# Altium footprint library Connectors.PcbLib: 408 footprints (part 12 of 26)
Each footprint in its own frame and in the unit in brackets; x right, y up, seen from the top. Pads: shape width x height; smd on the part's side, far side on the other; paste and mask are expansions set on the pad; w line width, h text height; cw(c..) or ccw(c..) is an arc to the next point about the centre after c.
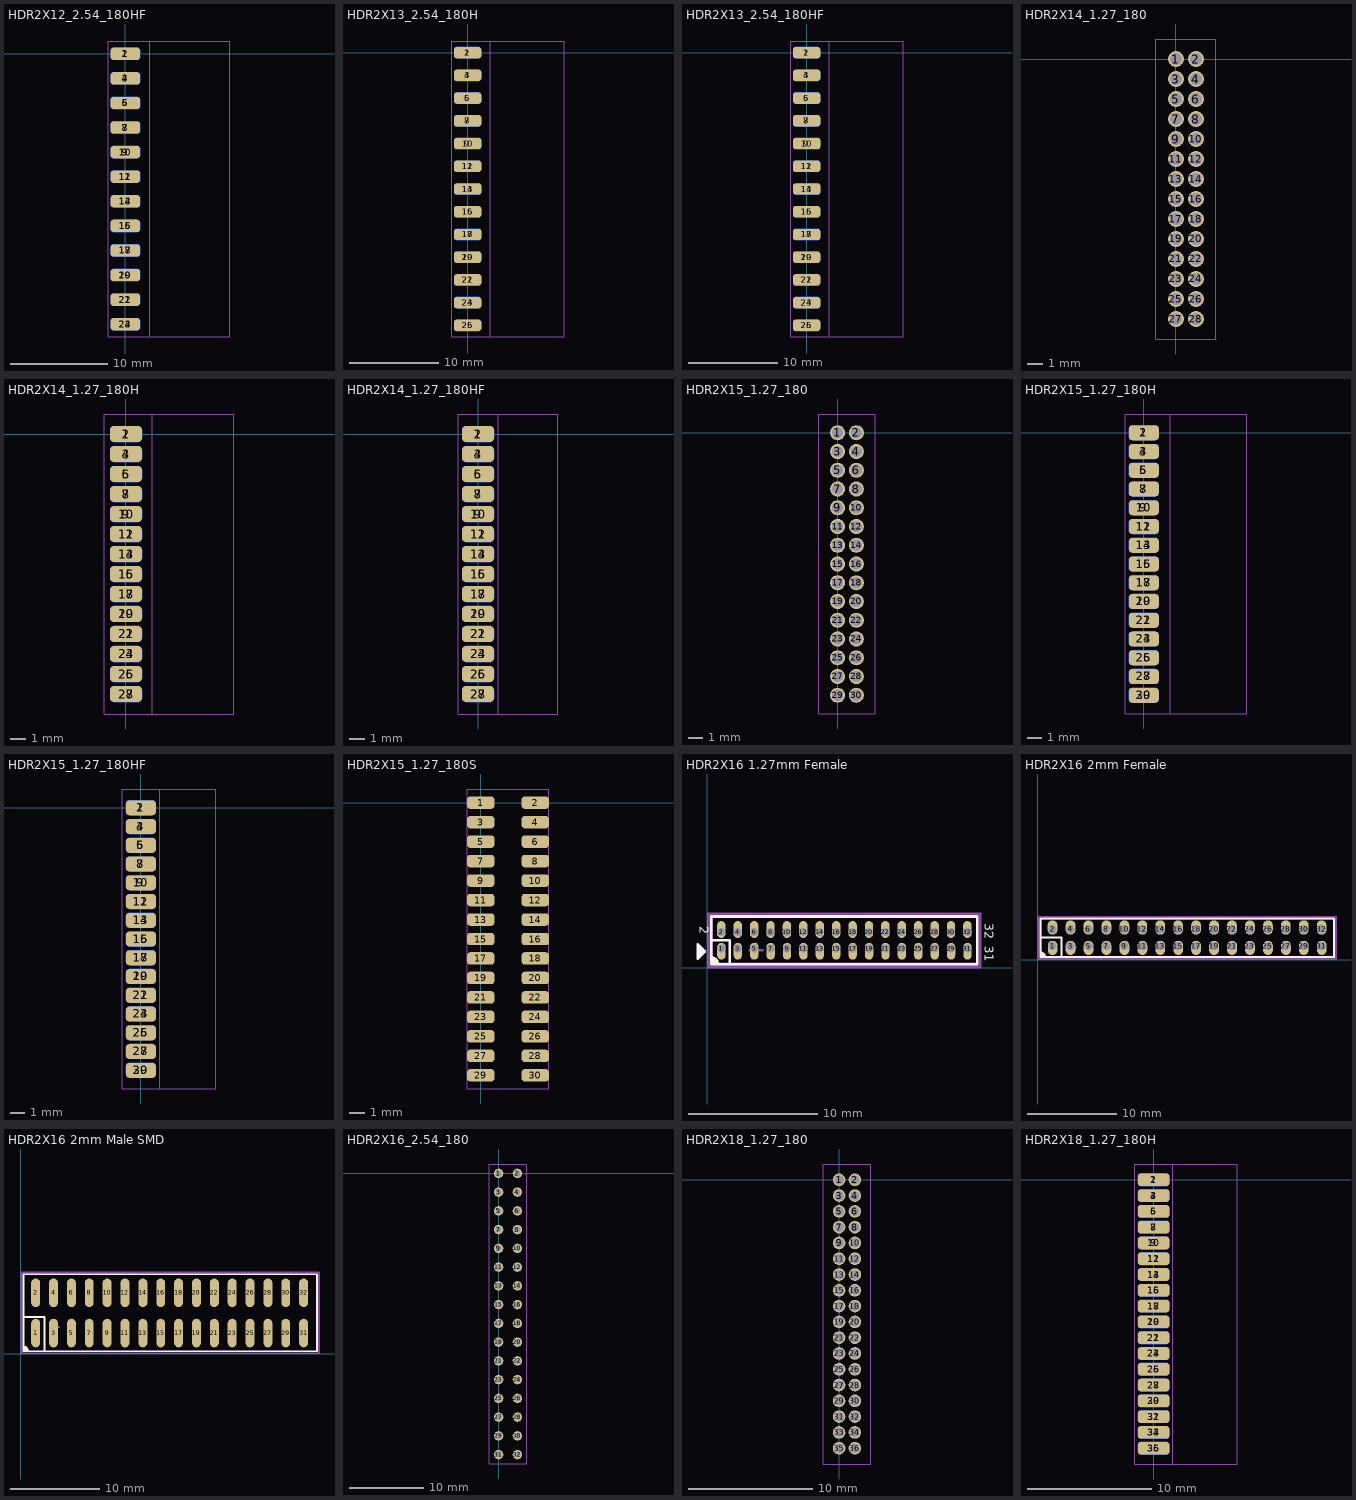
[diagram p11: the footprints below, top view; thin cyan lines are the x and y axes]

## HDR2X12_2.54_180HF [mil]
height 169.29
pads (24):
  rrect50% 120x50 smd: 1(0,0) 3(0,-100) 5(0,-200) 7(0,-300) 9(0,-400) 11(0,-500) 13(0,-600) 15(0,-700) 17(0,-800) 19(0,-900) 21(0,-1000) 23(0,-1100)
  rrect50% 120x50 smd far side: 2(0,0) 4(0,-100) 6(0,-200) 8(0,-300) 10(0,-400) 12(0,-500) 14(0,-600) 16(0,-700) 18(0,-800) 20(0,-900) 22(0,-1000) 24(0,-1100)
Mechanical 13:
  lines w2: -70,-1150 -70,50 425,50 425,-1150 -70,-1150
Mechanical 14:
  lines w2: -70,-1150 -70,50 100,50 100,-1150 -70,-1150
  text ".Designator" at -31,-570 h80
Mechanical 15:
  lines w2: -70,-1150 100,-1150 100,50 -70,50 -70,-1150
3D body "female_header_a-bl254-dg-g24d.stp": height 76.43, standoff -120.43, extent -35.97,-1154.92 424.66,54.92

## HDR2X13_2.54_180H [mil]
height 169.29
pads (26):
  rrect50% 120x50 smd: 1(0,0) 3(0,-100) 5(0,-200) 7(0,-300) 9(0,-400) 11(0,-500) 13(0,-600) 15(0,-700) 17(0,-800) 19(0,-900) 21(0,-1000) 23(0,-1100) 25(0,-1200)
  rrect50% 120x50 smd far side: 2(0,0) 4(0,-100) 6(0,-200) 8(0,-300) 10(0,-400) 12(0,-500) 14(0,-600) 16(0,-700) 18(0,-800) 20(0,-900) 22(0,-1000) 24(0,-1100) 26(0,-1200)
Mechanical 13:
  lines w2: -70,-1250 425,-1250 425,50 -70,50 -70,-1250
Mechanical 14:
  lines w2: -70,-1250 100,-1250 100,50 -70,50 -70,-1250
  text ".Designator" at -31,-620 h80
Mechanical 15:
  lines w2: -70,-1250 100,-1250 100,50 -70,50 -70,-1250
3D body "pin_header_awl254-dg-g26d.stp": height 100, standoff -100, extent -36.38,-1250 416.38,50

## HDR2X13_2.54_180HF [mil]
height 169.29
pads (26):
  rrect50% 120x50 smd: 1(0,0) 3(0,-100) 5(0,-200) 7(0,-300) 9(0,-400) 11(0,-500) 13(0,-600) 15(0,-700) 17(0,-800) 19(0,-900) 21(0,-1000) 23(0,-1100) 25(0,-1200)
  rrect50% 120x50 smd far side: 2(0,0) 4(0,-100) 6(0,-200) 8(0,-300) 10(0,-400) 12(0,-500) 14(0,-600) 16(0,-700) 18(0,-800) 20(0,-900) 22(0,-1000) 24(0,-1100) 26(0,-1200)
Mechanical 13:
  lines w2: -70,-1250 -70,50 425,50 425,-1250 -70,-1250
Mechanical 14:
  lines w2: -70,-1250 -70,50 100,50 100,-1250 -70,-1250
  text ".Designator" at -31,-620 h80
Mechanical 15:
  lines w2: -70,-1250 -70,50 100,50 100,-1250 -70,-1250
3D body "female_header_a-bl254-dg-g26d.stp": height 76.43, standoff -120.43, extent -35.98,-1254.92 424.65,54.92

## HDR2X14_1.27_180 [mil]
height 169.29
pads (28):
  round 40 hole 30: 1(0,0) 2(50,0) 3(0,-50) 4(50,-50) 5(0,-100) 6(50,-100) 7(0,-150) 8(50,-150) 9(0,-200) 10(50,-200) 11(0,-250) 12(50,-250) 13(0,-300) 14(50,-300) 15(0,-350) 16(50,-350) 17(0,-400) 18(50,-400) 19(0,-450) 20(50,-450) 21(0,-500) 22(50,-500) 23(0,-550) 24(50,-550) 25(0,-600) 26(50,-600) 27(0,-650) 28(50,-650)
Mechanical 13:
  lines w2: -50,-700 -50,50 100,50 100,-700 -50,-700
Mechanical 14:
  lines w2: -50,-700 -50,50 100,50 100,-700 -50,-700
  text ".Designator" at -6,-345 h80
3D body "pin_header_a-sl127-dg-g28d.stp": height 210.24, standoff -102.36, extent -73.42,-674.99 123.43,25.01

## HDR2X14_1.27_180H [mil]
height 169.29
pads (28):
  rrect50% 80x40 smd: 1(0,0) 3(0,-50) 5(0,-100) 7(0,-150) 9(0,-200) 11(0,-250) 13(0,-300) 15(0,-350) 17(0,-400) 19(0,-450) 21(0,-500) 23(0,-550) 25(0,-600) 27(0,-650)
  rrect50% 80x40 smd far side: 2(0,0) 4(0,-50) 6(0,-100) 8(0,-150) 10(0,-200) 12(0,-250) 14(0,-300) 16(0,-350) 18(0,-400) 20(0,-450) 22(0,-500) 24(0,-550) 26(0,-600) 28(0,-650)
Mechanical 13:
  lines w2: -55,-700 -55,50 270,50 270,-700 -55,-700
Mechanical 14:
  lines w2: -55,-700 -55,50 65,50 65,-700 -55,-700
  text ".Designator" at -31,-345 h80
3D body "pin_header_a-sl127-dg-g28d.stp": height 76.43, standoff -120.43, extent -41.22,-675 271.38,25

## HDR2X14_1.27_180HF [mil]
height 169.29
pads (28):
  rrect50% 80x40 smd: 1(0,0) 3(0,-50) 5(0,-100) 7(0,-150) 9(0,-200) 11(0,-250) 13(0,-300) 15(0,-350) 17(0,-400) 19(0,-450) 21(0,-500) 23(0,-550) 25(0,-600) 27(0,-650)
  rrect50% 80x40 smd far side: 2(0,0) 4(0,-50) 6(0,-100) 8(0,-150) 10(0,-200) 12(0,-250) 14(0,-300) 16(0,-350) 18(0,-400) 20(0,-450) 22(0,-500) 24(0,-550) 26(0,-600) 28(0,-650)
Mechanical 13:
  lines w2: -50,-700 200,-700 200,50 -50,50 -50,-700
Mechanical 14:
  lines w2: -50,-700 50,-700 50,50 -50,50 -50,-700
  text ".Designator" at -31,-345 h80
3D body "female_header_a-bl127-dg-g28d.stp": height 40.02, standoff -82.02, extent -28.34,-682.88 200.01,32.87

## HDR2X15_1.27_180 [mil]
height 169.29
pads (30):
  round 40 hole 30: 1(0,0) 2(50,0) 3(0,-50) 4(50,-50) 5(0,-100) 6(50,-100) 7(0,-150) 8(50,-150) 9(0,-200) 10(50,-200) 11(0,-250) 12(50,-250) 13(0,-300) 14(50,-300) 15(0,-350) 16(50,-350) 17(0,-400) 18(50,-400) 19(0,-450) 20(50,-450) 21(0,-500) 22(50,-500) 23(0,-550) 24(50,-550) 25(0,-600) 26(50,-600) 27(0,-650) 28(50,-650) 29(0,-700) 30(50,-700)
Mechanical 13:
  lines w2: -50,-750 100,-750 100,50 -50,50 -50,-750
Mechanical 14:
  lines w2: -50,-750 100,-750 100,50 -50,50 -50,-750
  text ".Designator" at -6,-395 h80
3D body "pin_header_a-sl127-dg-g30d.stp": height 210.24, standoff -102.36, extent -73.43,-724.99 123.42,25

## HDR2X15_1.27_180H [mil]
height 169.29
pads (30):
  rrect50% 80x40 smd: 1(0,0) 3(0,-50) 5(0,-100) 7(0,-150) 9(0,-200) 11(0,-250) 13(0,-300) 15(0,-350) 17(0,-400) 19(0,-450) 21(0,-500) 23(0,-550) 25(0,-600) 27(0,-650) 29(0,-700)
  rrect50% 80x40 smd far side: 2(0,0) 4(0,-50) 6(0,-100) 8(0,-150) 10(0,-200) 12(0,-250) 14(0,-300) 16(0,-350) 18(0,-400) 20(0,-450) 22(0,-500) 24(0,-550) 26(0,-600) 28(0,-650) 30(0,-700)
Mechanical 13:
  lines w2: -50,-750 275,-750 275,50 -50,50 -50,-750
Mechanical 14:
  lines w2: -50,-750 70,-750 70,50 -50,50 -50,-750
  text ".Designator" at -26,-370 h80
3D body "pin_header_a-sl127-dg-g30d.stp": height 76.43, standoff -120.43, extent -36.22,-724.99 276.38,25

## HDR2X15_1.27_180HF [mil]
height 169.29
pads (30):
  rrect50% 80x40 smd: 1(0,0) 3(0,-50) 5(0,-100) 7(0,-150) 9(0,-200) 11(0,-250) 13(0,-300) 15(0,-350) 17(0,-400) 19(0,-450) 21(0,-500) 23(0,-550) 25(0,-600) 27(0,-650) 29(0,-700)
  rrect50% 80x40 smd far side: 2(0,0) 4(0,-50) 6(0,-100) 8(0,-150) 10(0,-200) 12(0,-250) 14(0,-300) 16(0,-350) 18(0,-400) 20(0,-450) 22(0,-500) 24(0,-550) 26(0,-600) 28(0,-650) 30(0,-700)
Mechanical 13:
  lines w2: -50,-750 200,-750 200,50 -50,50 -50,-750
Mechanical 14:
  lines w2: -50,-750 50,-750 50,50 -50,50 -50,-750
  text ".Designator" at -31,-370 h80
3D body "female_header_a-bl127-dg-g30d.stp": height 40.02, standoff -82.02, extent -28.34,-732.88 200.01,32.87

## HDR2X15_1.27_180S [mil]
height 169.29
pads (30):
  rrect50% 70x32 smd: 1(0,0) 2(140,0) 3(0,-50) 4(140,-50) 5(0,-100) 6(140,-100) 7(0,-150) 8(140,-150) 9(0,-200) 10(140,-200) 11(0,-250) 12(140,-250) 13(0,-300) 14(140,-300) 15(0,-350) 16(140,-350) 17(0,-400) 18(140,-400) 19(0,-450) 20(140,-450) 21(0,-500) 22(140,-500) 23(0,-550) 24(140,-550) 25(0,-600) 26(140,-600) 27(0,-650) 28(140,-650) 29(0,-700) 30(140,-700)
Mechanical 13:
  lines w2: -35,-735 -35,35 175,35 175,-735 -35,-735
Mechanical 14:
  lines w2: -35,-735 -35,35 175,35 175,-735 -35,-735
  text ".Designator" at 44,-370 h80
3D body "pin_header_a-sl127-dg-g30mp1.stp": height 252.13, standoff 0.25, extent -38.31,-725 178.31,25

## HDR2X16 1.27mm Female [mm]
pads (32):
  oval 0.65x1.3 hole 0.6 copper offset 0,-0.2: 1(1.09,1.5) 3(2.36,1.5) 5(3.631,1.5) 7(4.901,1.5) 9(6.171,1.5) 11(7.442,1.5) 13(8.712,1.5) 15(9.982,1.5) 17(11.253,1.5) 19(12.523,1.5) 21(13.793,1.5) 23(15.064,1.5) 25(16.334,1.5) 27(17.604,1.5) 29(18.875,1.5) 31(20.145,1.5)
  oval 0.65x1.3 hole 0.6 copper offset 0,0.2: 2(1.083,2.78) 4(2.354,2.78) 6(3.624,2.78) 8(4.894,2.78) 10(6.165,2.78) 12(7.435,2.78) 14(8.705,2.78) 16(9.976,2.78) 18(11.246,2.78) 20(12.516,2.78) 22(13.787,2.78) 24(15.057,2.78) 26(16.327,2.78) 28(17.598,2.78) 30(18.868,2.78) 32(20.138,2.78)
Top Overlay:
  rectangle: -0.56,1.06 -0.31,1.5
  rectangle: -0.73,0.92 -0.48,1.65
  region: 0.25,0.3 0.25,0.78 0.5,0.78 0.79,0.49 0.79,0.3
  lines w0.2: 0.3,0.82 cw(c0.3,0.32) 0.8,0.32 ; 0.3,2.15 1.73,2.15 1.73,0.37 ; 0.34,0.64 0.37,0.64 cw(c0.37,0.3) 0.71,0.3 ; -0.74,0.72 -0.74,1.82 -0.19,1.27 -0.74,0.72 ; 0.3,0.3 20.9,0.3 20.9,3.99 0.3,3.99 0.3,0.3
  text "31" at 21.23,1.73 h1.2
  text "32" at 21.23,3.47 h1.2
  text "2" at -0.8,3.22 h1.2
Mechanical 13:
  lines w0.2: 0.32,0.31 0.32,3.97 20.89,3.97 20.89,0.31 0.32,0.31
Mechanical 15:
  lines w0.2: 3.28,1.36 4.28,1.36 ; 3.78,0.86 3.78,1.86 ; 0.09,0.08 21.12,0.08 21.12,4.21 0.09,4.21 0.09,0.08
3D body "2002111100032t1lf.stp": height 5.5, standoff -2.35, extent 0.435,0.44 20.755,3.84

## HDR2X16 2mm Female [mm]
pads (32):
  oval 1.1x1.6 hole 0.9 copper offset 0,-0.2: 1(1.666,1.51) 3(3.674,1.51) 5(5.683,1.51) 7(7.691,1.51) 9(9.699,1.51) 11(11.708,1.51) 13(13.716,1.51) 15(15.724,1.51) 17(17.733,1.51) 19(19.741,1.51) 21(21.749,1.51) 23(23.758,1.51) 25(25.766,1.51) 27(27.774,1.51) 29(29.783,1.51) 31(31.791,1.51)
  oval 1.1x1.6 hole 0.9 copper offset 0,0.2: 2(1.66,3.4) 4(3.669,3.4) 6(5.677,3.4) 8(7.685,3.4) 10(9.694,3.4) 12(11.702,3.4) 14(13.71,3.4) 16(15.719,3.4) 18(17.727,3.4) 20(19.735,3.4) 22(21.744,3.4) 24(23.752,3.4) 26(25.76,3.4) 28(27.769,3.4) 30(29.777,3.4) 32(31.785,3.4)
Top Overlay:
  region: 0.25,0.3 0.25,0.78 0.5,0.78 0.79,0.49 0.79,0.3
  lines w0.2: 0.3,0.82 cw(c0.3,0.32) 0.8,0.32 ; 0.3,2.465 2.665,2.465 2.665,0.37 ; 0.34,0.64 0.37,0.64 cw(c0.37,0.3) 0.71,0.3 ; 0.3,0.3 33.18,0.3 33.18,4.59 0.3,4.59 0.3,0.3
Bottom Overlay:
  region: 0.25,0.3 0.25,0.78 0.5,0.78 0.79,0.49 0.79,0.3
  lines w0.2: 0.3,0.82 cw(c0.3,0.32) 0.8,0.32 ; 0.3,2.465 2.665,2.465 2.665,0.37 ; 0.34,0.64 0.37,0.64 cw(c0.37,0.3) 0.71,0.3 ; 0.3,0.3 33.18,0.3 33.18,4.59 0.3,4.59 0.3,0.3
Mechanical 13:
  lines w0.2: 0.32,0.31 0.32,4.57 33.17,4.57 33.17,0.31 0.32,0.31
Mechanical 15:
  lines w0.2: 3.28,1.36 4.28,1.36 ; 3.78,0.86 3.78,1.86 ; 0.09,0.08 33.39,0.08 33.39,4.8 0.09,4.8 0.09,0.08
3D body "62003221821.stp": height 4.35, standoff -2.65, extent 0.44,0.44 33.04,4.44

## HDR2X16 2mm Male SMD [mm]
pads (32):
  oval 1x3.2 smd: 1(1.657,2.341) 2(1.657,6.841) 3(3.658,2.341) 4(3.658,6.841) 5(5.657,2.341) 6(5.657,6.841) 7(7.657,2.341) 8(7.657,6.841) 9(9.657,2.341) 10(9.657,6.841) 11(11.656,2.341) 12(11.656,6.841) 13(13.656,2.341) 14(13.656,6.841) 15(15.656,2.341) 16(15.656,6.841) 17(17.655,2.341) 18(17.655,6.841) 19(19.655,2.341) 20(19.655,6.841) 21(21.655,2.341) 22(21.655,6.841) 23(23.654,2.341) 24(23.654,6.841) 25(25.654,2.341) 26(25.654,6.841) 27(27.654,2.341) 28(27.654,6.841) 29(29.653,2.341) 30(29.653,6.841) 31(31.653,2.341) 32(31.653,6.841)
Top Overlay:
  region: 0.242,0.301 0.242,0.781 0.492,0.781 0.782,0.491 0.782,0.301
  lines w0.2: 0.292,0.821 cw(c0.292,0.321) 0.792,0.321 ; 0.292,4.138 2.657,4.138 2.657,0.371 ; 0.332,0.641 0.362,0.641 cw(c0.362,0.301) 0.702,0.301 ; 0.292,0.301 33.15,0.301 33.15,8.928 0.292,8.928 0.292,0.301
Mechanical 13:
  lines w0.2: 0.104,0.082 0.104,9.114 33.372,9.114 33.372,0.082 0.104,0.082
Mechanical 15:
  lines w0.2: 3.272,3.001 4.272,3.001 ; 3.772,2.501 3.772,3.501 ; 0.082,0.082 33.372,0.082 33.372,9.12 0.082,9.12 0.082,0.082
3D body "User Library-pin_header_a-sl200-dg-g12mp1.STEP": height 6.5, standoff 0, extent 20.677,1.34 32.627,7.84
3D body "User Library-pin_header_a-sl200-dg-g12mp1.STEP": height 6.5, standoff 0, extent 10.665,1.338 22.615,7.838
3D body "User Library-pin_header_a-sl200-dg-g12mp1.STEP": height 6.5, standoff 0, extent 0.693,1.342 12.643,7.842

## HDR2X16_2.54_180 [mil]
height 169.29
pads (32):
  round 50 hole 32: 1(0,0) 2(100,0) 3(0,-100) 4(100,-100) 5(0,-200) 6(100,-200) 7(0,-300) 8(100,-300) 9(0,-400) 10(100,-400) 11(0,-500) 12(100,-500) 13(0,-600) 14(100,-600) 15(0,-700) 16(100,-700) 17(0,-800) 18(100,-800) 19(0,-900) 20(100,-900) 21(0,-1000) 22(100,-1000) 23(0,-1100) 24(100,-1100) 25(0,-1200) 26(100,-1200) 27(0,-1300) 28(100,-1300) 29(0,-1400) 30(100,-1400) 31(0,-1500) 32(100,-1500)
Mechanical 13:
  lines w2: -50,-1550 -50,50 150,50 150,-1550 -50,-1550
Mechanical 14:
  lines w2: -50,-1550 -50,50 150,50 150,-1550 -50,-1550
  text ".Designator" at 19,-770 h80
3D body "pin_header_awl254-dg-g32d.stp": height 334.65, standoff -118.11, extent -50,-1550 150,50

## HDR2X18_1.27_180 [mil]
height 169.29
pads (36):
  round 40 hole 30: 1(0,0) 2(50,0) 3(0,-50) 4(50,-50) 5(0,-100) 6(50,-100) 7(0,-150) 8(50,-150) 9(0,-200) 10(50,-200) 11(0,-250) 12(50,-250) 13(0,-300) 14(50,-300) 15(0,-350) 16(50,-350) 17(0,-400) 18(50,-400) 19(0,-450) 20(50,-450) 21(0,-500) 22(50,-500) 23(0,-550) 24(50,-550) 25(0,-600) 26(50,-600) 27(0,-650) 28(50,-650) 29(0,-700) 30(50,-700) 31(0,-750) 32(50,-750) 33(0,-800) 34(50,-800) 35(0,-850) 36(49.99,-850)
Mechanical 13:
  lines w2: -50,-900 -50,50 100,50 100,-900 -50,-900
Mechanical 14:
  lines w2: -50,-900 -50,50 100,50 100,-900 -50,-900
  text ".Designator" at -6,-445 h80
3D body "pin_header_a-sl127-dg-g36d.stp": height 210.24, standoff -102.36, extent -73.43,-874.99 123.43,25.01

## HDR2X18_1.27_180H [mil]
height 169.29
pads (36):
  rrect50% 100x40 smd: 1(0,0) 3(0,-50) 5(0,-100) 7(0,-150) 9(0,-200) 11(0,-250) 13(0,-300) 15(0,-350) 17(0,-400) 19(0,-450) 21(0,-500) 23(0,-550) 25(0,-600) 27(0,-650) 29(0,-700) 31(0,-750) 33(0,-800) 35(0,-850)
  rrect50% 100x40 smd far side: 2(0,0) 4(0,-50) 6(0,-100) 8(0,-150) 10(0,-200) 12(0,-250) 14(0,-300) 16(0,-350) 18(0,-400) 20(0,-450) 22(0,-500) 24(0,-550) 26(0,-600) 28(0,-650) 30(0,-700) 32(0,-750) 34(0,-800) 36(0,-850)
Mechanical 13:
  lines w2: -60,-900 -60,50 265,50 265,-900 -60,-900
Mechanical 14:
  lines w2: -60,-900 -60,50 60,50 60,-900 -60,-900
  text ".Designator" at -31,-445 h80
3D body "pin_header_a-sl127-dg-g36d.stp": height 76.43, standoff -120.43, extent -47.36,-874.99 265.24,25.01